# Altium footprint library PcbLibLafe.PcbLib: 294 footprints (part 1 of 19)
Each footprint in its own frame and in the unit in brackets; x right, y up, seen from the top. Pads: shape width x height; smd on the part's side, far side on the other; paste and mask are expansions set on the pad; w line width, h text height; cw(c..) or ccw(c..) is an arc to the next point about the centre after c.
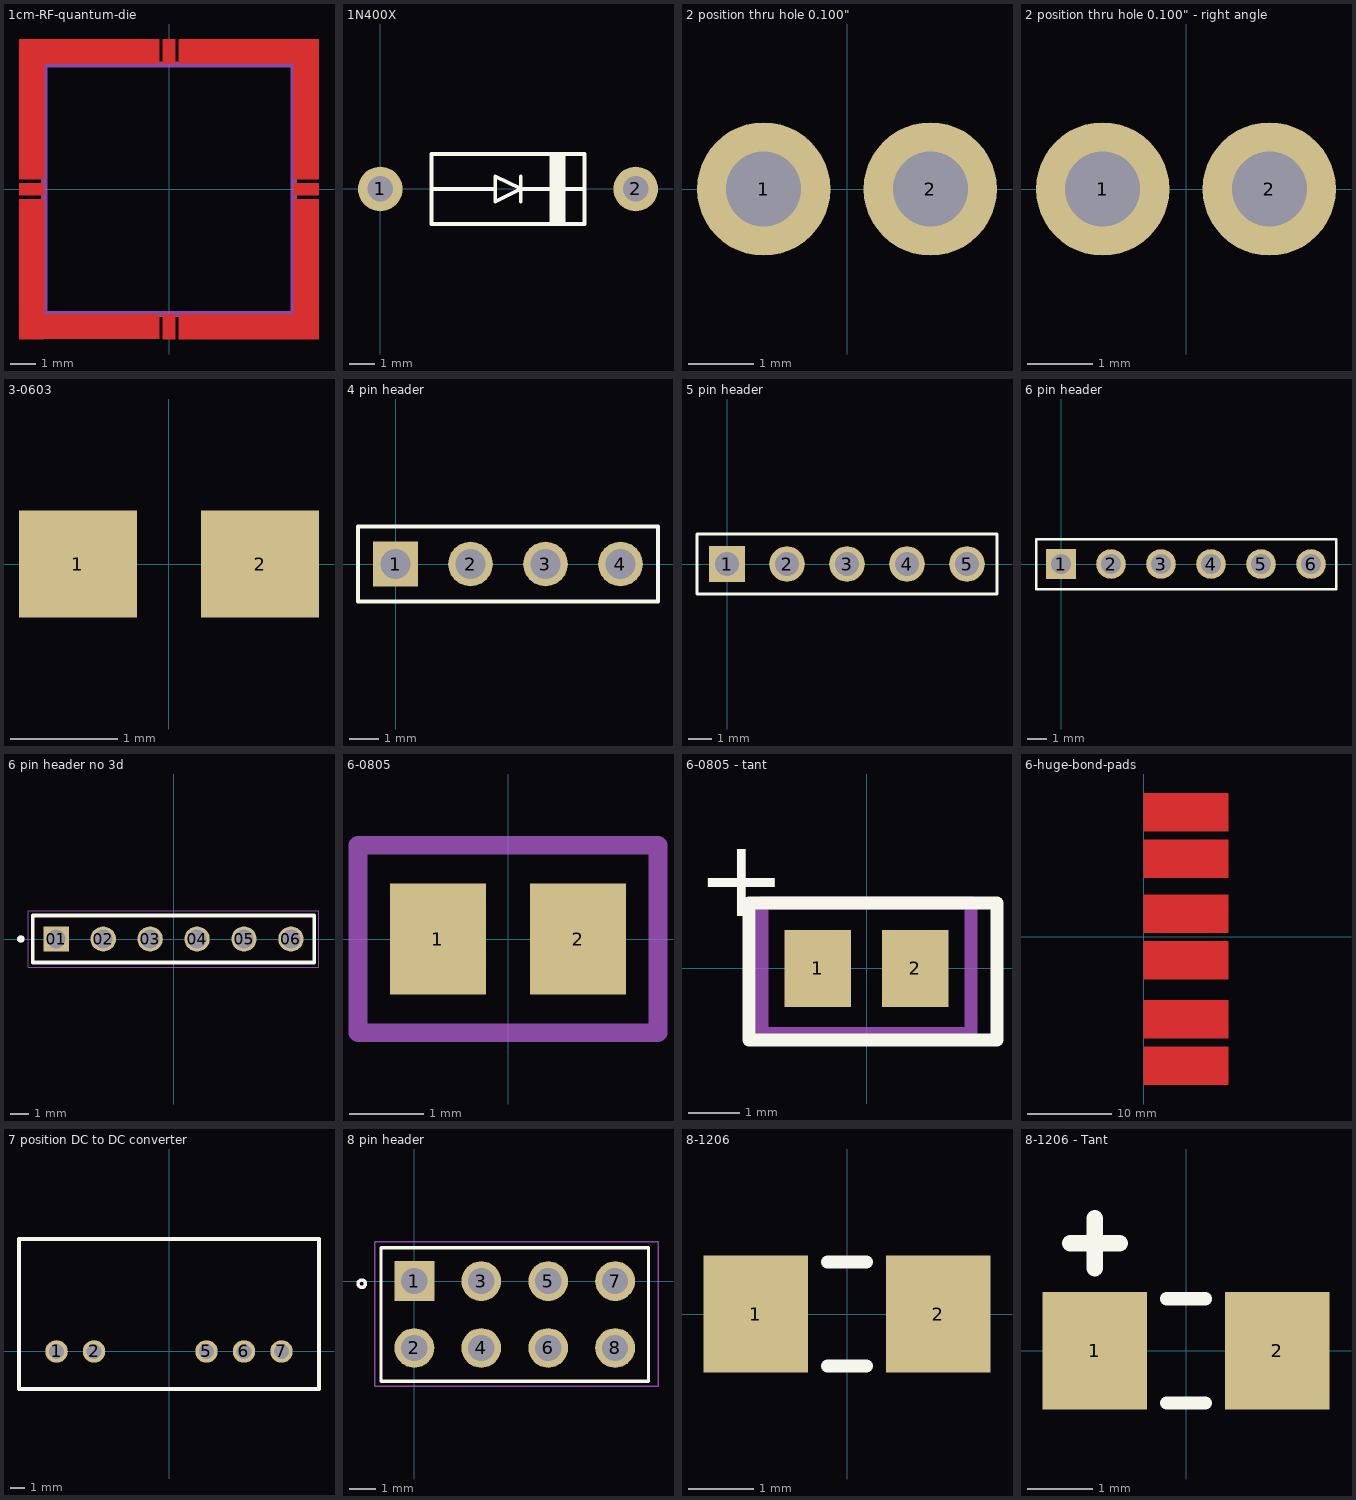
[diagram p0: the footprints below, top view; thin cyan lines are the x and y axes]

## 1cm-RF-quantum-die [mil]
Top Layer:
  region: -15.75,-196.85 -15.75,-236.22 -196.85,-236.22 -196.85,-196.85
  region: -236.22,-15.75 -196.85,-15.75 -196.85,-236.22 -236.22,-236.22
  region: -196.85,-9.75 -236.22,-9.75 -236.22,9.84 -196.85,9.84
  region: -196.85,15.75 -236.22,15.75 -236.22,197.83 -196.85,197.83
  region: -15.75,237.2 -15.75,197.83 -236.22,197.83 -236.22,237.2
  region: -9.75,197.83 -9.75,237.2 9.75,237.2 9.75,197.83
  region: 15.75,197.83 15.75,237.2 196.85,237.2 196.85,197.83
  region: 236.22,15.75 196.85,15.75 196.85,237.2 236.22,237.2
  region: 196.85,9.75 236.22,9.75 236.22,-9.75 196.85,-9.75
  region: 196.85,-15.75 236.22,-15.75 236.22,-196.85 196.85,-196.85
  region: 15.75,-236.22 15.75,-196.85 236.22,-196.85 236.22,-236.22
  region: 9.75,-196.85 9.75,-236.22 -9.75,-236.22 -9.75,-196.85
Top Solder:
  rectangle: -236.22,-236.22 236.22,236.22
Top Component Outline:
  lines w10: -196.85,-196.85 -196.85,196.85 196.85,196.85 196.85,-196.85 -196.85,-196.85

## 1N400X [mil]
pads (2):
  round 70 hole 40: 1(0,0) 2(400,0)
Top Overlay:
  rectangle: 264.97,-55.11 289.97,54.89
  lines w6: 180,0 80,0 ; 220,-20 220,20 ; 318,0 280,0 220,0 ; 80,0 80,55 320,55 320,0 320,-55 80,-55 80,0 ; 220,0 180,20 180,-20 220,0
3D body: height 60, standoff -100, extent 386.06,-14.94 415.94,15
3D body: height 75, standoff 45, extent 386.08,-14.87 415.92,15
3D body: height 75, standoff 45, extent -14,-14.94 15.84,14.94
3D body: height 60, standoff -100, extent -13.94,-14.94 15.94,15
3D body: height 74.88, standoff 45, extent 0,-15 400,14.94
3D body: height 115.56, standoff 4, extent 254,-55.78 294,56
3D body: height 114.57, standoff 5, extent 79,-54.78 319,55

## 2 position thru hole 0.100" [mil]
pads (2):
  round 80 hole 45: 1(-50,0) 2(50,0)

## 2 position thru hole 0.100" - right angle [mil]
pads (2):
  round 80 hole 45: 1(-50,0) 2(50,0)
3D body "10129379-902001BLF.STEP": height 170.31, standoff -232.05, extent -107.5,-45.5 92.5,169.46

## 3-0603 [mm] "Chip Resistor; Body 1.6 x 0.9 mm (LxW typ)"
height 0.55
pads (2):
  rect 1.1x1 smd: 1(-0.85,0) 2(0.85,0)

## 4 pin header [mm]
pads (4):
  rect 1.508x1.508 hole 1: 1(0,0)
  round 1.508 hole 1: 2(2.54,0) 3(5.08,0) 4(7.62,0)
Top Overlay:
  lines w0.127: -1.27,-1.27 8.89,-1.27 8.89,1.27 -1.27,1.27 -1.27,-1.27
3D body "c-3-641215-4-z-3d.stp": height 10.03, standoff -3.56, extent -1.27,-2.667 8.89,3.175

## 5 pin header [mm]
pads (5):
  rect 1.508x1.508 hole 1: 1(0,0)
  round 1.508 hole 1: 2(2.54,0) 3(5.08,0) 4(7.62,0) 5(10.16,0)
Top Overlay:
  lines w0.127: -1.27,-1.27 11.43,-1.27 11.43,1.27 -1.27,1.27 -1.27,-1.27
3D body "c-3-641215-5-z-3d.stp": height 10.03, standoff -3.56, extent -1.18,-2.589 11.52,3.253

## 6 pin header [mm]
pads (6):
  rect 1.508x1.508 hole 1: 1(0,0)
  round 1.508 hole 1: 2(2.54,0) 3(5.08,0) 4(7.62,0) 5(10.16,0) 6(12.7,0)
Top Overlay:
  lines w0.127: -1.27,-1.27 -1.27,1.27 13.97,1.27 13.97,-1.27 -1.27,-1.27

## 6 pin header no 3d [mm]
pads (6):
  rect 1.37x1.37 hole 1.02: 01(-6.35,0)
  round 1.37 hole 1.02: 02(-3.81,0) 03(-1.27,0) 04(1.27,0) 05(3.81,0) 06(6.35,0)
Top Overlay:
  circle w0.2: c-8.27,0 r0.1
  lines w0.2: -7.62,-1.27 -7.62,1.27 7.62,1.27 7.62,-1.27 -7.62,-1.27
Mechanical 13:
  circle w0.2: c-8.27,0 r0.1
  lines w0.1: -7.62,-1.27 -7.62,1.27 ; -7.62,-1.27 7.62,-1.27 ; -7.62,-1.27 -7.62,1.27 ; -7.62,1.27 7.62,1.27 ; -7.62,1.27 7.62,1.27 ; 7.62,-1.27 7.62,1.27 ; 7.62,-1.27 7.62,1.27
Mechanical 15:
  lines w0.05: -7.87,-1.52 -7.87,1.52 7.87,1.52 7.87,-1.52 -7.87,-1.52

## 6-0805 [mm] "Chip Resistor; Body 2 x 1.2 mm (LxW typ)"
height 0.7
pads (2):
  rect 1.3x1.5 smd: 1(-0.95,0) 2(0.95,0)
Mechanical 40:
  lines w0.254: -2.032,-1.27 -2.032,1.27 2.032,1.27 2.032,-1.27 -2.032,-1.27

## 6-0805 - tant [mm] "Chip Cap tant; Body 2 x 1.2 mm (LxW typ)"
height 0.7
pads (2):
  rect 1.3x1.5 smd: 1(-0.95,0) 2(0.95,0)
Top Overlay:
  lines w0.254: -2.286,-1.397 2.54,-1.397 2.54,1.27 -2.286,1.27 -2.286,-1.397
  text "+" at -3.302,1.016 h1.52
Mechanical 40:
  lines w0.254: -2.032,-1.27 -2.032,1.27 2.032,1.27 2.032,-1.27 -2.032,-1.27
3D body: height 0.66, standoff 0, extent 0.584,-0.635 0.991,0.635
3D body: height 0.66, standoff 0, extent -1.067,-0.635 -0.66,0.635
3D body: height 0.64, standoff 0, extent -1.041,-0.61 0.965,0.61

## 6-huge-bond-pads [mil]
Top Layer:
  region: 0,19.68 393.7,19.68 393.7,196.85 0,196.85
  region: 0,-19.68 393.7,-19.68 393.7,-196.85 0,-196.85
  region: 0,492.13 393.7,492.13 393.7,669.29 0,669.29
  region: 0,452.76 393.7,452.76 393.7,275.59 0,275.59
  region: 0,-472.44 393.7,-472.44 393.7,-295.28 0,-295.28
  region: 0,-511.81 393.7,-511.81 393.7,-688.98 0,-688.98
Top Solder:
  region: -19.68,-708.66 413.39,-708.66 413.39,688.98 -19.68,688.98

## 7 position DC to DC converter [mil]
height 470
pads (5):
  round 60 hole 40: 1(-300,0) 2(-200,0) 5(100,0) 6(200,0) 7(300,0)
Top Overlay:
  lines w10: -400,-100 -400,300 400,300 400,-100 -400,-100

## 8 pin header [mm]
pads (8):
  rect 1.508x1.508 hole 1: 1(0,0)
  round 1.508 hole 1: 2(0,-2.54) 3(2.54,0) 4(2.54,-2.54) 5(5.08,0) 6(5.08,-2.54) 7(7.62,0) 8(7.62,-2.54)
Top Overlay:
  circle w0.127: c-2,-0.1 r0.141
  lines w0.127: -1.27,-3.81 8.89,-3.81 8.89,1.27 -1.27,1.27 -1.27,-3.81
Mechanical 15:
  lines w0.05: -1.5,-4 9.25,-4 9.25,1.5 -1.5,1.5 -1.5,-4

## 8-1206 [mm] "Chip Resistor; Body 3.1 x 1.6 mm (LxW typ)"
height 0.7
pads (2):
  rect 1.6x1.8 smd: 1(-1.4,0) 2(1.4,0)
Top Overlay:
  lines w0.2: -0.3,-0.8 0.3,-0.8 ; -0.3,0.8 0.3,0.8
3D body "GRM31CR71H475KA12L.step": height 1.6, standoff 0, extent -1.58,-0.983 1.62,0.917

## 8-1206 - Tant [mm] "Chip Resistor; Body 3.1 x 1.6 mm (LxW typ)"
height 0.7
pads (2):
  rect 1.6x1.8 smd: 1(-1.4,0) 2(1.4,0)
Top Overlay:
  lines w0.2: -0.3,-0.8 0.3,-0.8 ; -0.3,0.8 0.3,0.8
  lines w0.254: -1.778,1.651 -1.016,1.651 ; -1.397,1.27 -1.397,2.032
3D body "GRM31CR71H475KA12L.step": height 1.6, standoff 0, extent -1.606,-0.945 1.594,0.955